# Altium footprint library Connectors_Old.PcbLib: 246 footprints (part 6 of 18) (continued)
## CNATCAZ2-40MV [mm] "ATCA Zone 2 40 shielded pairs male vertical backplane" (continued)
3D body: height 8.25, standoff -2.5, extent -0.258,-15.203 0.25,-14.822
3D body: height 8.25, standoff -2.5, extent -7.758,-13.703 -7.25,-13.322
3D body: height 8.25, standoff -2.5, extent -5.258,-13.703 -4.75,-13.322
3D body: height 8.25, standoff -2.5, extent -5.258,-15.203 -4.75,-14.822
3D body: height 8.25, standoff -2.5, extent -7.758,-15.203 -7.25,-14.822
3D body: height 8.25, standoff -2.5, extent -2.758,-13.703 -2.25,-13.322
3D body: height 8.25, standoff -2.5, extent -2.758,-15.203 -2.25,-14.822
3D body: height 8.25, standoff -2.5, extent -15.258,-13.703 -14.75,-13.322
3D body: height 8.25, standoff -2.5, extent -12.758,-13.703 -12.25,-13.322
3D body: height 8.25, standoff -2.5, extent -12.758,-15.203 -12.25,-14.822
3D body: height 8.25, standoff -2.5, extent -15.258,-15.203 -14.75,-14.822
3D body: height 8.25, standoff -2.5, extent -10.258,-13.703 -9.75,-13.322
3D body: height 8.25, standoff -2.5, extent -10.258,-15.203 -9.75,-14.822
3D body: height 8.25, standoff -2.5, extent -22.758,-13.703 -22.25,-13.322
3D body: height 8.25, standoff -2.5, extent -20.258,-13.703 -19.75,-13.322
3D body: height 8.25, standoff -2.5, extent -20.258,-15.203 -19.75,-14.822
3D body: height 8.25, standoff -2.5, extent -22.758,-15.203 -22.25,-14.822
3D body: height 8.25, standoff -2.5, extent -17.758,-13.703 -17.25,-13.322
3D body: height 8.25, standoff -2.5, extent -17.758,-15.203 -17.25,-14.822
3D body: height 8.25, standoff -2.5, extent -0.258,-9.203 0.25,-8.822
3D body: height 8.25, standoff -2.5, extent -0.258,-10.703 0.25,-10.322
3D body: height 8.25, standoff -2.5, extent -7.758,-9.203 -7.25,-8.822
3D body: height 8.25, standoff -2.5, extent -5.258,-9.203 -4.75,-8.822
3D body: height 8.25, standoff -2.5, extent -5.258,-10.703 -4.75,-10.322
3D body: height 8.25, standoff -2.5, extent -7.758,-10.703 -7.25,-10.322
3D body: height 8.25, standoff -2.5, extent -2.758,-9.203 -2.25,-8.822
3D body: height 8.25, standoff -2.5, extent -2.758,-10.703 -2.25,-10.322
3D body: height 8.25, standoff -2.5, extent -15.258,-9.203 -14.75,-8.822
3D body: height 8.25, standoff -2.5, extent -12.758,-9.203 -12.25,-8.822
3D body: height 8.25, standoff -2.5, extent -12.758,-10.703 -12.25,-10.322
3D body: height 8.25, standoff -2.5, extent -15.258,-10.703 -14.75,-10.322
3D body: height 8.25, standoff -2.5, extent -10.258,-9.203 -9.75,-8.822
3D body: height 8.25, standoff -2.5, extent -10.258,-10.703 -9.75,-10.322
3D body: height 8.25, standoff -2.5, extent -22.758,-9.203 -22.25,-8.822
3D body: height 8.25, standoff -2.5, extent -20.258,-9.203 -19.75,-8.822
3D body: height 8.25, standoff -2.5, extent -20.258,-10.703 -19.75,-10.322
3D body: height 8.25, standoff -2.5, extent -22.758,-10.703 -22.25,-10.322
3D body: height 8.25, standoff -2.5, extent -17.758,-9.203 -17.25,-8.822
3D body: height 8.25, standoff -2.5, extent -17.758,-10.703 -17.25,-10.322
3D body: height 8.25, standoff -2.5, extent -22.758,-4.703 -22.25,-4.322
3D body: height 8.25, standoff -2.5, extent -20.258,-4.703 -19.75,-4.322
3D body: height 8.25, standoff -2.5, extent -20.258,-6.203 -19.75,-5.822
3D body: height 8.25, standoff -2.5, extent -22.758,-6.203 -22.25,-5.822
3D body: height 8.25, standoff -2.5, extent -17.758,-4.703 -17.25,-4.322
3D body: height 8.25, standoff -2.5, extent -17.758,-6.203 -17.25,-5.822
3D body: height 8.25, standoff -2.5, extent -15.258,-4.703 -14.75,-4.322
3D body: height 8.25, standoff -2.5, extent -12.758,-4.703 -12.25,-4.322
3D body: height 8.25, standoff -2.5, extent -12.758,-6.203 -12.25,-5.822
3D body: height 8.25, standoff -2.5, extent -15.258,-6.203 -14.75,-5.822
3D body: height 8.25, standoff -2.5, extent -10.258,-4.703 -9.75,-4.322
3D body: height 8.25, standoff -2.5, extent -10.258,-6.203 -9.75,-5.822
3D body: height 8.25, standoff -2.5, extent -7.758,-4.703 -7.25,-4.322
3D body: height 8.25, standoff -2.5, extent -5.258,-4.703 -4.75,-4.322
3D body: height 8.25, standoff -2.5, extent -5.258,-6.203 -4.75,-5.822
3D body: height 8.25, standoff -2.5, extent -7.758,-6.203 -7.25,-5.822
3D body: height 8.25, standoff -2.5, extent -2.758,-4.703 -2.25,-4.322
3D body: height 8.25, standoff -2.5, extent -2.758,-6.203 -2.25,-5.822
3D body: height 8.25, standoff -2.5, extent -0.258,-4.703 0.25,-4.322
3D body: height 8.25, standoff -2.5, extent -0.258,-6.203 0.25,-5.822
3D body: height 8.25, standoff -2.5, extent -0.258,-0.203 0.25,0.178
3D body: height 8.25, standoff -2.5, extent -0.258,-1.703 0.25,-1.322
3D body: height 8.25, standoff -2.5, extent -7.758,-0.203 -7.25,0.178
3D body: height 8.25, standoff -2.5, extent -5.258,-0.203 -4.75,0.178
3D body: height 8.25, standoff -2.5, extent -5.258,-1.703 -4.75,-1.322
3D body: height 8.25, standoff -2.5, extent -7.758,-1.703 -7.25,-1.322
3D body: height 8.25, standoff -2.5, extent -2.758,-0.203 -2.25,0.178
3D body: height 8.25, standoff -2.5, extent -2.758,-1.703 -2.25,-1.322
3D body: height 8.25, standoff -2.5, extent -15.258,-0.203 -14.75,0.178
3D body: height 8.25, standoff -2.5, extent -12.758,-0.203 -12.25,0.178
3D body: height 8.25, standoff -2.5, extent -12.758,-1.703 -12.25,-1.322
3D body: height 8.25, standoff -2.5, extent -15.258,-1.703 -14.75,-1.322
3D body: height 8.25, standoff -2.5, extent -10.258,-0.203 -9.75,0.178
3D body: height 8.25, standoff -2.5, extent -10.258,-1.703 -9.75,-1.322
3D body: height 8.25, standoff -2.5, extent -17.758,-1.703 -17.25,-1.322
3D body: height 8.25, standoff -2.5, extent -17.758,-0.203 -17.25,0.178
3D body: height 8.25, standoff -2.5, extent -22.758,-1.703 -22.25,-1.322
3D body: height 8.25, standoff -2.5, extent -20.258,-1.703 -19.75,-1.322
3D body: height 8.25, standoff -2.5, extent -20.258,-0.203 -19.75,0.178
3D body: height 8.25, standoff -2.5, extent -22.758,-0.203 -22.25,0.178
3D body: height 13.4, standoff 0, extent -24.15,3.4 0.3,4.165
3D body: height 13.4, standoff 0, extent -24.15,-19.265 0.3,-18.5
3D body: height 2.95, standoff 0, extent -24.15,-18.5 0.75,3.4
3D body: height 0, standoff -2.5, extent -22.758,-3.203 -22.25,-2.822
3D body: height 0, standoff -2.5, extent -20.258,-3.203 -19.75,-2.822
3D body: height 0, standoff -2.5, extent -17.758,-3.203 -17.25,-2.822
3D body: height 0, standoff -2.5, extent -15.258,-3.203 -14.75,-2.822
3D body: height 0, standoff -2.5, extent -12.758,-3.203 -12.25,-2.822
3D body: height 0, standoff -2.5, extent -10.258,-3.203 -9.75,-2.822
3D body: height 0, standoff -2.5, extent -7.758,-3.203 -7.25,-2.822
3D body: height 0, standoff -2.5, extent -5.258,-3.203 -4.75,-2.822
3D body: height 0, standoff -2.5, extent -2.758,-3.203 -2.25,-2.822
3D body: height 0, standoff -2.5, extent -0.258,-3.203 0.25,-2.822
3D body: height 0, standoff -2.5, extent -0.258,-7.703 0.25,-7.322
3D body: height 0, standoff -2.5, extent -2.758,-7.703 -2.25,-7.322
3D body: height 0, standoff -2.5, extent -5.258,-7.703 -4.75,-7.322
3D body: height 0, standoff -2.5, extent -7.758,-7.703 -7.25,-7.322
3D body: height 0, standoff -2.5, extent -10.258,-7.703 -9.75,-7.322
3D body: height 0, standoff -2.5, extent -12.758,-7.703 -12.25,-7.322
3D body: height 0, standoff -2.5, extent -15.258,-7.703 -14.75,-7.322
3D body: height 0, standoff -2.5, extent -17.758,-7.703 -17.25,-7.322
3D body: height 0, standoff -2.5, extent -20.258,-7.703 -19.75,-7.322
3D body: height 0, standoff -2.5, extent -22.758,-7.703 -22.25,-7.322
3D body: height 0, standoff -2.5, extent -0.258,-12.203 0.25,-11.822
3D body: height 0, standoff -2.5, extent -2.758,-12.203 -2.25,-11.822
3D body: height 0, standoff -2.5, extent -5.258,-12.203 -4.75,-11.822
3D body: height 0, standoff -2.5, extent -7.758,-12.203 -7.25,-11.822
3D body: height 0, standoff -2.5, extent -10.258,-12.203 -9.75,-11.822
3D body: height 0, standoff -2.5, extent -12.758,-12.203 -12.25,-11.822
3D body: height 0, standoff -2.5, extent -15.258,-12.203 -14.75,-11.822
3D body: height 0, standoff -2.5, extent -17.758,-12.203 -17.25,-11.822
3D body: height 0, standoff -2.5, extent -20.258,-12.203 -19.75,-11.822
3D body: height 0, standoff -2.5, extent -22.758,-12.203 -22.25,-11.822
3D body: height 0, standoff -2.5, extent -0.258,-16.703 0.25,-16.322
3D body: height 0, standoff -2.5, extent -2.758,-16.703 -2.25,-16.322
3D body: height 0, standoff -2.5, extent -5.258,-16.703 -4.75,-16.322
3D body: height 0, standoff -2.5, extent -7.758,-16.703 -7.25,-16.322
3D body: height 0, standoff -2.5, extent -10.258,-16.703 -9.75,-16.322
3D body: height 0, standoff -2.5, extent -12.758,-16.703 -12.25,-16.322
3D body: height 0, standoff -2.5, extent -15.258,-16.703 -14.75,-16.322
3D body: height 0, standoff -2.5, extent -17.758,-16.703 -17.25,-16.322
3D body: height 0, standoff -2.5, extent -20.258,-16.703 -19.75,-16.322
3D body: height 0, standoff -2.5, extent -22.758,-16.703 -22.25,-16.322

## CNBNCPCBH1 [mm] "TYCO AMP BNC PCB horizontal"
height 15.9
pads (4):
  round 1.8 hole 1: 1(0,0) 2(0,-2.54)
  round 0 hole 2 unplated mask+1.5: MH1(-5.08,5.08) MH2(-5.08,-5.08)
Top Overlay:
  lines w0.15: -12.5,-6.4 -20.7,-6.4 -20.7,6.4 -12.5,6.4 ; -12.5,-7.5 -12.5,7.5 2.1,7.5 2.1,4.9 1.4,4.9 1.4,-4.9 2.1,-4.9 2.1,-7.5 -12.5,-7.5
Mechanical 13:
  circle w0.1: c-29.4,0 r1.005
  lines w0.102: -21.2,-4.5 -21.6,-4.5 ; -21.2,4.5 -21.6,4.5 ; -12.45,-6.3 -20.5,-6.3 -21.2,-5.6 -21.2,5.6 -20.5,6.3 -12.45,6.3 ; -21.6,-4.5 -21.6,-4.8 -33.6,-4.8 -33.6,4.8 -21.6,4.8 -21.6,4.5 ; -21.6,-4.5 -21.6,4.5 ; -12.45,-7.4 1.9,-7.4 1.9,-5 1.3,-5 1.3,5 1.9,5 1.9,7.4 -12.45,7.4 -12.45,-7.4
Mechanical 15:
  lines w0.102: -0.8,0 0.8,0 ; 0,-0.7 0,0.7
3D body: height 12.6, standoff 0, extent -21.2,-6.3 -12.45,6.3
3D body: height 15.9, standoff 0, extent -12.45,-7.4 1.9,7.4
3D body: height 11.7, standoff 2.1, extent -33.6,-4.8 -21.2,4.8

## CNBNCPCBH2 [mm] "Telegartner BNC PCB horizontal J01003A0030"
height 16.1
pads (5):
  round 2 hole 1.2: 1(0,0) 2(-5.08,-5.08) 2(-5.08,5.08) 2(5.08,-5.08) 2(5.08,5.08)
Top Overlay:
  lines w0.15: -6.1,-6.1 6.1,-6.1 6.1,6.1 -6.1,6.1 -6.1,-6.1
Mechanical 13:
  circle w0.1: c-23.8,0 r1.005
  lines w0.102: -6,-4.8 -27.3,-4.8 -27.3,4.8 -6,4.8 ; -6,-6 -6,6 6,6 6,-6 -6,-6
Mechanical 15:
  lines w0.102: -0.8,0 0.8,0 ; 0,-0.7 0,0.7
3D body: height 12.1, standoff 0, extent -6,-6 6,6
3D body: height 11.35, standoff 1.65, extent -27.3,-4.8 -6,4.8

## CNBNCPCBH3 [mm] "Tyco BNC PCB horizontal 1-1337494-0"
height 15.2
pads (4):
  round 1.7 hole 0.9: 1(5.08,0) 2(5.08,-2.54)
  round 2.8 hole 2: 2(0,-5.08) 2(0.025,5.08)
Top Overlay:
  lines w0.15: -7.7,-7.5 -7.7,7.5 6.6,7.5 6.6,-7.5 -7.7,-7.5
Mechanical 13:
  circle w0.1: c-23.8,0 r1.005
  lines w0.1: -15.4,-5.5 -15.4,5.5
  lines w0.102: -7.65,-6.223 -15.183,-6.223 -15.7,-4.5 -28.65,-4.5 -28.65,4.5 -15.7,4.5 -15.183,6.223 -7.65,6.223 ; -7.65,-7.38 6.92,-7.38 6.92,7.38 -7.65,7.38 -7.65,-7.38
Mechanical 15:
  lines w0.102: -0.8,0 0.8,0 ; 0,-0.7 0,0.7
3D body: height 8.7, standoff 7.7, extent -28.67,-0.498 -28.65,0.498
3D body: height 12.19, standoff 4.21, extent -28.66,-4 -28.65,3.968
3D body: height 0.4, standoff -3.6, extent -0.794,4.278 0.8,5.875
3D body: height 0.4, standoff -3.6, extent -0.8,-5.875 0.794,-4.278
3D body: height 14.49, standoff 1.91, extent -15.65,-6.275 -7.65,6.275
3D body: height 12.69, standoff 3.71, extent -28.65,-4.482 -7.65,4.482
3D body: height 15.2, standoff 0.4, extent -7.65,-7.38 6.55,7.38
3D body: height 0.4, standoff 0, extent -6.604,-6.604 -3.568,-3.562
3D body: height 0.4, standoff 0, extent 3.556,-6.604 6.592,-3.562
3D body: height 0.4, standoff 0, extent 3.556,3.562 6.592,6.604
3D body: height 0.4, standoff 0, extent -6.604,3.562 -3.568,6.604

## CNCOMEXP4408MM [mm] "Connector Com Express 2x220pin R0.5mm 8mm height"
height 8
pads (450):
  rect 0.3x1.2 smd: A1(-27.25,-8.7) A2(-26.75,-8.7) A3(-26.25,-8.7) A4(-25.75,-8.7) A5(-25.25,-8.7) A6(-24.75,-8.7) A7(-24.25,-8.7) A8(-23.75,-8.7) A9(-23.25,-8.7) A10(-22.75,-8.7) A11(-22.25,-8.7) A12(-21.75,-8.7) A13(-21.25,-8.7) A14(-20.75,-8.7) A15(-20.25,-8.7) A16(-19.75,-8.7) A17(-19.25,-8.7) A18(-18.75,-8.7) A19(-18.25,-8.7) A20(-17.75,-8.7) A21(-17.25,-8.7) A22(-16.75,-8.7) A23(-16.25,-8.7) A24(-15.75,-8.7) A25(-15.25,-8.7) A26(-14.75,-8.7) A27(-14.25,-8.7) A28(-13.75,-8.7) A29(-13.25,-8.7) A30(-12.75,-8.7) A31(-12.25,-8.7) A32(-11.75,-8.7) A33(-11.25,-8.7) A34(-10.75,-8.7) A35(-10.25,-8.7) A36(-9.75,-8.7) A37(-9.25,-8.7) A38(-8.75,-8.7) A39(-8.25,-8.7) A40(-7.75,-8.7) A41(-7.25,-8.7) A42(-6.75,-8.7) A43(-6.25,-8.7) A44(-5.75,-8.7) A45(-5.25,-8.7) A46(-4.75,-8.7) A47(-4.25,-8.7) A48(-3.75,-8.7) A49(-3.25,-8.7) A50(-2.75,-8.7) A51(-2.25,-8.7) A52(-1.75,-8.7) A53(-1.25,-8.7) A54(-0.75,-8.7) A55(-0.25,-8.7) A56(0.25,-8.7) A57(0.75,-8.7) A58(1.25,-8.7) A59(1.75,-8.7) A60(2.25,-8.7) A61(2.75,-8.7) A62(3.25,-8.7) A63(3.75,-8.7) A64(4.25,-8.7) A65(4.75,-8.7) A66(5.25,-8.7) A67(5.75,-8.7) A68(6.25,-8.7) A69(6.75,-8.7) A70(7.25,-8.7) A71(7.75,-8.7) A72(8.25,-8.7) A73(8.75,-8.7) A74(9.25,-8.7) A75(9.75,-8.7) A76(10.25,-8.7) A77(10.75,-8.7) A78(11.25,-8.7) A79(11.75,-8.7) A80(12.25,-8.7) A81(12.75,-8.7) A82(13.25,-8.7) A83(13.75,-8.7) A84(14.25,-8.7) A85(14.75,-8.7) A86(15.25,-8.7) A87(15.75,-8.7) A88(16.25,-8.7) A89(16.75,-8.7) A90(17.25,-8.7) A91(17.75,-8.7) A92(18.25,-8.7) A93(18.75,-8.7) A94(19.25,-8.7) A95(19.75,-8.7) A96(20.25,-8.7) A97(20.75,-8.7) A98(21.25,-8.7) A99(21.75,-8.7) A100(22.25,-8.7) A101(22.75,-8.7) A102(23.25,-8.7) A103(23.75,-8.7) A104(24.25,-8.7) A105(24.75,-8.7) A106(25.25,-8.7) A107(25.75,-8.7) A108(26.25,-8.7) A109(26.75,-8.7) A110(27.25,-8.7) B1(-27.25,-3.3) B2(-26.75,-3.3) B3(-26.25,-3.3) B4(-25.75,-3.3) B5(-25.25,-3.3) B6(-24.75,-3.3) B7(-24.25,-3.3) B8(-23.75,-3.3) B9(-23.25,-3.3) B10(-22.75,-3.3) B11(-22.25,-3.3) B12(-21.75,-3.3) B13(-21.25,-3.3) B14(-20.75,-3.3) B15(-20.25,-3.3) B16(-19.75,-3.3) B17(-19.25,-3.3) B18(-18.75,-3.3) B19(-18.25,-3.3) B20(-17.75,-3.3) B21(-17.25,-3.3) B22(-16.75,-3.3) B23(-16.25,-3.3) B24(-15.75,-3.3) B25(-15.25,-3.3) B26(-14.75,-3.3) B27(-14.25,-3.3) B28(-13.75,-3.3) B29(-13.25,-3.3) B30(-12.75,-3.3) B31(-12.25,-3.3) B32(-11.75,-3.3) B33(-11.25,-3.3) B34(-10.75,-3.3) B35(-10.25,-3.3) B36(-9.75,-3.3) B37(-9.25,-3.3) B38(-8.75,-3.3) B39(-8.25,-3.3) B40(-7.75,-3.3) B41(-7.25,-3.3) B42(-6.75,-3.3) B43(-6.25,-3.3) B44(-5.75,-3.3) B45(-5.25,-3.3) B46(-4.75,-3.3) B47(-4.25,-3.3) B48(-3.75,-3.3) B49(-3.25,-3.3) B50(-2.75,-3.3) B51(-2.25,-3.3) B52(-1.75,-3.3) B53(-1.25,-3.3) B54(-0.75,-3.3) B55(-0.25,-3.3) B56(0.25,-3.3) B57(0.75,-3.3) B58(1.25,-3.3) B59(1.75,-3.3) B60(2.25,-3.3) B61(2.75,-3.3) B62(3.25,-3.3) B63(3.75,-3.3) B64(4.25,-3.3) B65(4.75,-3.3) B66(5.25,-3.3) B67(5.75,-3.3) B68(6.25,-3.3) B69(6.75,-3.3) B70(7.25,-3.3) B71(7.75,-3.3) B72(8.25,-3.3) B73(8.75,-3.3) B74(9.25,-3.3) B75(9.75,-3.3) B76(10.25,-3.3) B77(10.75,-3.3) B78(11.25,-3.3) B79(11.75,-3.3) B80(12.25,-3.3) B81(12.75,-3.3) B82(13.25,-3.3) B83(13.75,-3.3) B84(14.25,-3.3) B85(14.75,-3.3) B86(15.25,-3.3) B87(15.75,-3.3) B88(16.25,-3.3) B89(16.75,-3.3) B90(17.25,-3.3) B91(17.75,-3.3) B92(18.25,-3.3) B93(18.75,-3.3) B94(19.25,-3.3) B95(19.75,-3.3) B96(20.25,-3.3) B97(20.75,-3.3) B98(21.25,-3.3) B99(21.75,-3.3) B100(22.25,-3.3) B101(22.75,-3.3) B102(23.25,-3.3) B103(23.75,-3.3) B104(24.25,-3.3) B105(24.75,-3.3) B106(25.25,-3.3) B107(25.75,-3.3) B108(26.25,-3.3) B109(26.75,-3.3) B110(27.25,-3.3) C1(-27.25,3.3) C2(-26.75,3.3) C3(-26.25,3.3) C4(-25.75,3.3) C5(-25.25,3.3) C6(-24.75,3.3) C7(-24.25,3.3) C8(-23.75,3.3) C9(-23.25,3.3) C10(-22.75,3.3) C11(-22.25,3.3) C12(-21.75,3.3) C13(-21.25,3.3) C14(-20.75,3.3) C15(-20.25,3.3) C16(-19.75,3.3) C17(-19.25,3.3) C18(-18.75,3.3) C19(-18.25,3.3) C20(-17.75,3.3) C21(-17.25,3.3) C22(-16.75,3.3) C23(-16.25,3.3) C24(-15.75,3.3) C25(-15.25,3.3) C26(-14.75,3.3) C27(-14.25,3.3) C28(-13.75,3.3) C29(-13.25,3.3) C30(-12.75,3.3) C31(-12.25,3.3) C32(-11.75,3.3) C33(-11.25,3.3) C34(-10.75,3.3) C35(-10.25,3.3) C36(-9.75,3.3) C37(-9.25,3.3) C38(-8.75,3.3) C39(-8.25,3.3) C40(-7.75,3.3) C41(-7.25,3.3) C42(-6.75,3.3) C43(-6.25,3.3) C44(-5.75,3.3) C45(-5.25,3.3) C46(-4.75,3.3) C47(-4.25,3.3) C48(-3.75,3.3) C49(-3.25,3.3) C50(-2.75,3.3) C51(-2.25,3.3) C52(-1.75,3.3) C53(-1.25,3.3) C54(-0.75,3.3) C55(-0.25,3.3) C56(0.25,3.3) C57(0.75,3.3) C58(1.25,3.3) C59(1.75,3.3) C60(2.25,3.3) C61(2.75,3.3) C62(3.25,3.3) C63(3.75,3.3) C64(4.25,3.3) C65(4.75,3.3) C66(5.25,3.3) C67(5.75,3.3) C68(6.25,3.3) C69(6.75,3.3) C70(7.25,3.3) C71(7.75,3.3) C72(8.25,3.3) C73(8.75,3.3) C74(9.25,3.3) C75(9.75,3.3) C76(10.25,3.3) C77(10.75,3.3) C78(11.25,3.3) C79(11.75,3.3) C80(12.25,3.3) C81(12.75,3.3) C82(13.25,3.3) C83(13.75,3.3) C84(14.25,3.3) C85(14.75,3.3) C86(15.25,3.3) C87(15.75,3.3) C88(16.25,3.3) C89(16.75,3.3) C90(17.25,3.3) C91(17.75,3.3) C92(18.25,3.3) C93(18.75,3.3) C94(19.25,3.3) C95(19.75,3.3) C96(20.25,3.3) C97(20.75,3.3) C98(21.25,3.3) C99(21.75,3.3) C100(22.25,3.3) C101(22.75,3.3) C102(23.25,3.3) C103(23.75,3.3) C104(24.25,3.3) C105(24.75,3.3) C106(25.25,3.3) C107(25.75,3.3) C108(26.25,3.3) C109(26.75,3.3) C110(27.25,3.3) D1(-27.25,8.7) D2(-26.75,8.7) D3(-26.25,8.7) D4(-25.75,8.7) D5(-25.25,8.7) D6(-24.75,8.7) D7(-24.25,8.7) D8(-23.75,8.7) D9(-23.25,8.7) D10(-22.75,8.7) D11(-22.25,8.7) D12(-21.75,8.7) D13(-21.25,8.7) D14(-20.75,8.7) D15(-20.25,8.7) D16(-19.75,8.7) D17(-19.25,8.7) D18(-18.75,8.7) D19(-18.25,8.7) D20(-17.75,8.7) D21(-17.25,8.7) D22(-16.75,8.7) D23(-16.25,8.7) D24(-15.75,8.7) D25(-15.25,8.7) D26(-14.75,8.7) D27(-14.25,8.7) D28(-13.75,8.7) D29(-13.25,8.7) D30(-12.75,8.7) D31(-12.25,8.7) D32(-11.75,8.7) D33(-11.25,8.7) D34(-10.75,8.7) D35(-10.25,8.7) D36(-9.75,8.7) D37(-9.25,8.7) D38(-8.75,8.7) D39(-8.25,8.7) D40(-7.75,8.7) D41(-7.25,8.7) D42(-6.75,8.7) D43(-6.25,8.7) D44(-5.75,8.7) D45(-5.25,8.7) D46(-4.75,8.7) D47(-4.25,8.7) D48(-3.75,8.7) D49(-3.25,8.7) D50(-2.75,8.7) D51(-2.25,8.7) D52(-1.75,8.7) D53(-1.25,8.7) D54(-0.75,8.7) D55(-0.25,8.7) D56(0.25,8.7) D57(0.75,8.7) D58(1.25,8.7) D59(1.75,8.7) D60(2.25,8.7) D61(2.75,8.7) D62(3.25,8.7) D63(3.75,8.7) D64(4.25,8.7) D65(4.75,8.7) D66(5.25,8.7) D67(5.75,8.7) D68(6.25,8.7) D69(6.75,8.7) D70(7.25,8.7) D71(7.75,8.7) D72(8.25,8.7) D73(8.75,8.7) D74(9.25,8.7) D75(9.75,8.7) D76(10.25,8.7) D77(10.75,8.7) D78(11.25,8.7) D79(11.75,8.7) D80(12.25,8.7) D81(12.75,8.7) D82(13.25,8.7) D83(13.75,8.7) D84(14.25,8.7) D85(14.75,8.7) D86(15.25,8.7) D87(15.75,8.7) D88(16.25,8.7) D89(16.75,8.7) D90(17.25,8.7) D91(17.75,8.7) D92(18.25,8.7) D93(18.75,8.7) D94(19.25,8.7) D95(19.75,8.7) D96(20.25,8.7) D97(20.75,8.7) D98(21.25,8.7) D99(21.75,8.7) D100(22.25,8.7) D101(22.75,8.7) D102(23.25,8.7) D103(23.75,8.7) D104(24.25,8.7) D105(24.75,8.7) D106(25.25,8.7) D107(25.75,8.7) D108(26.25,8.7) D109(26.75,8.7) D110(27.25,8.7)
  round 5.5 hole 2.7 mask+0.2: MH1(-41.35,-8) MH2(75.65,-8) MH3(75.65,79) MH4(-41.35,79) MH5(34.65,-8) MH6(45.65,79)
  round 0 hole 0.9 unplated mask+0.6: MH7(-28.85,-6) MH9(-28.85,6)
  round 0 hole 1.6 unplated mask+0.95: MH8(28.85,-6) MH10(28.85,6)
Top Layer:
  region: 29.75,-4.35 31.4,-4.35 31.4,-7.65 29.75,-7.65 29.75,-6.8 29.95,-6.45 29.95,-5.55 29.75,-5.2
  region: 29.75,7.65 31.4,7.65 31.4,4.35 29.75,4.35 29.75,5.2 29.95,5.55 29.95,6.45 29.75,6.8
  region: -29.75,-7.65 -31.4,-7.65 -31.4,-4.35 -29.75,-4.35 -29.75,-5.2 -29.95,-5.55 -29.95,-6.45 -29.75,-6.8
  region: -29.75,4.35 -31.4,4.35 -31.4,7.65 -29.75,7.65 -29.75,6.8 -29.95,6.45 -29.95,5.55 -29.75,5.2
Top Solder:
  region: 29.65,-4.25 31.5,-4.25 31.5,-7.75 29.65,-7.75 29.65,-6.7 29.85,-6.4 29.85,-5.6 29.65,-5.3
  region: 29.65,7.75 31.5,7.75 31.5,4.25 29.65,4.25 29.65,5.3 29.85,5.6 29.85,6.4 29.65,6.7
  region: -29.65,-7.75 -31.5,-7.75 -31.5,-4.25 -29.65,-4.25 -29.65,-5.3 -29.85,-5.6 -29.85,-6.4 -29.65,-6.7
  region: -29.65,4.25 -31.5,4.25 -31.5,7.75 -29.65,7.75 -29.65,6.7 -29.85,6.4 -29.85,5.6 -29.65,5.3
Mechanical 13:
  lines w0.127: -30,-7.463 -30.9,-7.463 -30.9,-8.613 -30.4,-9.113 -28.55,-9.112 -28.55,-8.113 ; -30,-7.338 -30.8,-7.338 -30.8,-4.663 -30,-4.663 ; -30,-4.537 -30.9,-4.537 -30.9,-3.213 cw(c-30.575,-3.213) -30.575,-2.887 -28.55,-2.887 -28.55,-3.888 ; -30,4.537 -30.9,4.537 -30.9,3.387 -30.4,2.887 -28.55,2.888 -28.55,3.888 ; -30,4.663 -30.8,4.663 -30.8,7.338 -30,7.338 ; -30,7.463 -30.9,7.463 -30.9,8.788 cw(c-30.575,8.788) -30.575,9.113 -28.55,9.113 -28.55,8.113 ; -29.75,-9.113 -29.75,-2.887 ; -29.75,-8.113 29.75,-8.113 ; -29.75,-7.813 -30,-7.813 -30,-4.187 -29.75,-4.187 ; -29.75,-3.888 29.75,-3.888 ; -29.75,2.887 -29.75,9.113 ; -29.75,3.888 29.75,3.888 ; -29.75,4.187 -30,4.187 -30,7.813 -29.75,7.813 ; -29.75,8.113 29.75,8.113 ; -29.15,-8.113 -29.15,-3.888 ; -29.15,3.888 -29.15,8.113 ; -28.35,-8.113 -28.35,-8.413 28.35,-8.413 28.35,-8.113 ; -28.35,-3.888 -28.35,-3.588 ; -28.35,-3.587 28.35,-3.587 ; -28.35,3.587 28.35,3.587 ; -28.35,3.588 -28.35,3.888 ; -28.35,8.113 -28.35,8.413 28.35,8.413 28.35,8.113 ; 28.35,-3.888 28.35,-3.588 ; 28.35,3.588 28.35,3.888 ; 28.55,-8.113 28.55,-9.113 30.4,-9.113 30.9,-8.612 30.9,-7.463 30,-7.463 ; 28.55,-3.888 28.55,-2.887 30.575,-2.887 cw(c30.575,-3.213) 30.9,-3.213 30.9,-4.537 30,-4.537 ; 28.55,3.888 28.55,2.887 30.4,2.887 30.9,3.388 30.9,4.537 30,4.537 ; 28.55,8.113 28.55,9.113 30.575,9.113 cw(c30.575,8.788) 30.9,8.788 30.9,7.463 30,7.463 ; 29.15,-8.113 29.15,-3.888 ; 29.15,3.888 29.15,8.113 ; 29.75,-9.113 29.75,-2.887 ; 29.75,-7.813 30,-7.813 30,-4.187 29.75,-4.187 ; 29.75,2.887 29.75,9.113 ; 29.75,4.187 30,4.187 30,7.813 29.75,7.813 ; 30,-7.338 30.8,-7.338 30.8,-4.663 30,-4.663 ; 30,4.663 30.8,4.663 30.8,7.338 30,7.338 ; -29.35,-8.438 -29.15,-8.788 -28.95,-8.438 -29.35,-8.438 ; -29.35,3.562 -28.95,3.562 -29.15,3.213 -29.35,3.562 ; -28.575,-7.388 28.575,-7.388 28.575,-5.663 27.75,-5.663 27.75,-4.613 -27.725,-4.613 -27.75,-4.638 -27.75,-5.663 -28.575,-5.663 -28.575,-7.388 ; -28.575,4.613 -28.575,6.338 -27.75,6.338 -27.75,7.362 -27.725,7.388 27.75,7.388 27.75,6.338 28.575,6.338 28.575,4.613 -28.575,4.613
Mechanical 14:
  circle w0.127: c28.85,-6 r0.5
  circle w0.127: c-28.85,-6 r0.35
  circle w0.127: c-28.85,6 r0.35
  circle w0.127: c28.85,6 r0.5
Mechanical 15:
  lines w0.25: -30.85,-5.975 -26.85,-6 ; -30.85,6.025 -26.85,6.025 ; -28.85,-8.975 -28.85,9.025 ; 26.85,-6 30.85,-6 ; 26.85,6 30.85,6 ; 28.85,-8.975 28.85,9.025 ; -45.35,-12 -45.35,83 79.65,83 79.65,-12 -45.35,-12
3D body: height 2, standoff 0, extent -30.906,-9.113 -29.75,-2.881
3D body: height 3.5, standoff 0, extent -29.75,-3.888 -28.55,-2.887
3D body: height 3.5, standoff 0, extent -29.75,-9.113 -28.55,-8.113
3D body: height 3.5, standoff 0, extent 28.55,-9.113 29.75,-8.113
3D body: height 3.5, standoff 0, extent 28.55,-3.888 29.75,-2.887
3D body: height 2.5, standoff 0, extent -28.575,-7.388 28.575,-4.613
3D body: height 7.45, standoff 0, extent -29.15,-8.113 29.15,-3.888
3D body: height 6.2, standoff 0, extent -29.75,-8.113 -29.15,-3.888
3D body: height 6.2, standoff 0, extent 29.15,-8.113 29.75,-3.888
3D body: height 2, standoff 0, extent 29.75,-9.113 30.906,-2.881
3D body: height 7.5, standoff 0.5, extent -28.35,-8.413 28.35,-8.113
3D body: height 7.5, standoff 0.5, extent -28.35,-3.887 28.35,-3.587
3D body: height 7.5, standoff 0.5, extent -28.35,8.113 28.35,8.413
3D body: height 7.5, standoff 0.5, extent -28.35,3.587 28.35,3.887
3D body: height 2, standoff 0, extent 29.75,2.887 30.906,9.119
3D body: height 6.2, standoff 0, extent 29.15,3.887 29.75,8.112
3D body: height 6.2, standoff 0, extent -29.75,3.887 -29.15,8.112
3D body: height 7.45, standoff 0, extent -29.15,3.887 29.15,8.112
3D body: height 2.5, standoff 0, extent -28.575,4.612 28.575,7.387
3D body: height 3.5, standoff 0, extent 28.55,8.112 29.75,9.112
3D body: height 3.5, standoff 0, extent 28.55,2.887 29.75,3.887
3D body: height 3.5, standoff 0, extent -29.75,2.887 -28.55,3.887
3D body: height 3.5, standoff 0, extent -29.75,8.112 -28.55,9.112
3D body: height 2, standoff 0, extent -30.906,2.887 -29.75,9.119
3D body: height 0, standoff -0.6, extent -29.207,-6.357 -28.493,-5.643
3D body: height 0, standoff -0.6, extent 28.34,-6.51 29.36,-5.49
3D body: height 0, standoff -0.6, extent 28.34,5.49 29.36,6.51
3D body: height 0, standoff -0.6, extent -29.207,5.643 -28.493,6.357